# Altium footprint library 6-Connectors-5.PcbLib: 46 footprints (part 5 of 5)
Each footprint in its own frame and in the unit in brackets; x right, y up, seen from the top. Pads: shape width x height; smd on the part's side, far side on the other; paste and mask are expansions set on the pad; w line width, h text height; cw(c..) or ccw(c..) is an arc to the next point about the centre after c.
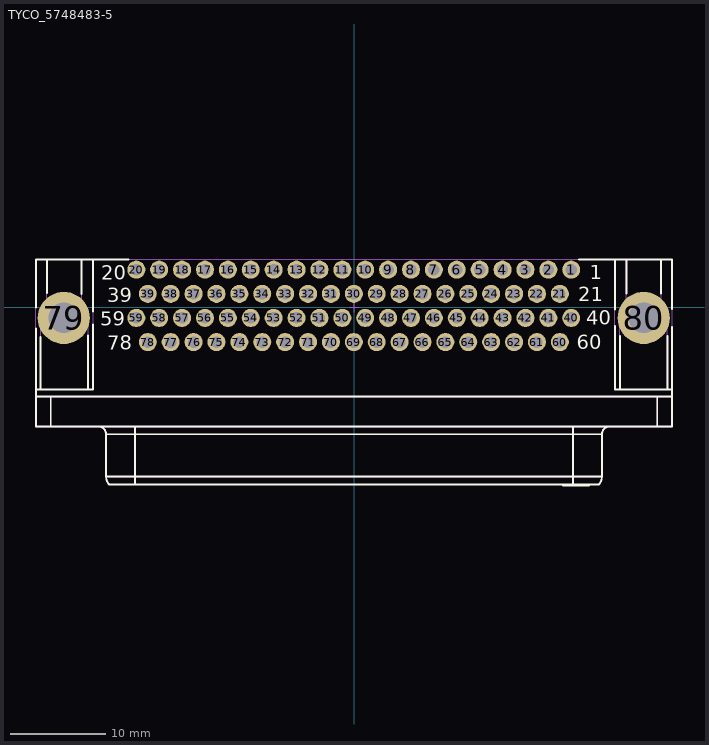
[diagram p4: the footprint, top view; thin cyan lines are the x and y axes]

## TYCO_5748483-5 [mm] "Right Angle D-SUB 78 Female Contacts, Shell Size 5, With Boardlock and Threaded Insert,(4-40 UNC), HD-22 Serie"
height 15.55
pads (80):
  round 1.9 hole 1.2: 1(22.87,3.965) 2(20.46,3.965) 3(18.05,3.965) 4(15.64,3.965) 5(13.23,3.965) 6(10.82,3.965) 7(8.41,3.965) 8(6,3.965) 9(3.59,3.965) 10(1.18,3.965) 11(-1.23,3.965) 12(-3.64,3.965) 13(-6.05,3.965) 14(-8.46,3.965) 15(-10.87,3.965) 16(-13.28,3.965) 17(-15.69,3.965) 18(-18.1,3.965) 19(-20.51,3.965) 20(-22.92,3.965) 21(21.67,1.425) 22(19.26,1.425) 23(16.85,1.425) 24(14.44,1.425) 25(12.03,1.425) 26(9.62,1.425) 27(7.21,1.425) 28(4.8,1.425) 29(2.39,1.425) 30(-0.02,1.425) 31(-2.43,1.425) 32(-4.84,1.425) 33(-7.25,1.425) 34(-9.66,1.425) 35(-12.07,1.425) 36(-14.48,1.425) 37(-16.89,1.425) 38(-19.3,1.425) 39(-21.71,1.425) 40(22.87,-1.115) 41(20.46,-1.115) 42(18.05,-1.115) 43(15.64,-1.115) 44(13.23,-1.115) 45(10.82,-1.115) 46(8.41,-1.115) 47(6,-1.115) 48(3.59,-1.115) 49(1.18,-1.115) 50(-1.23,-1.115) 51(-3.64,-1.115) 52(-6.05,-1.115) 53(-8.46,-1.115) 54(-10.87,-1.115) 55(-13.28,-1.115) 56(-15.69,-1.115) 57(-18.1,-1.115) 58(-20.51,-1.115) 59(-22.92,-1.115) 60(21.67,-3.655) 61(19.26,-3.655) 62(16.85,-3.655) 63(14.44,-3.655) 64(12.03,-3.655) 65(9.62,-3.655) 66(7.21,-3.655) 67(4.8,-3.655) 68(2.39,-3.655) 69(-0.02,-3.655) 70(-2.43,-3.655) 71(-4.84,-3.655) 72(-7.25,-3.655) 73(-9.66,-3.655) 74(-12.07,-3.655) 75(-14.48,-3.655) 76(-16.89,-3.655) 77(-19.3,-3.655) 78(-21.71,-3.655)
  round 5.5 hole 3.2: 79(-30.55,-1.115) 80(30.5,-1.115)
Top Overlay:
  lines w0.2: -33.5,-9.405 33.5,-9.405 ; -33.5,-8.645 -27.47,-8.645 -27.47,-1.775 ; -33.5,-2.22 -33.5,-12.545 33.5,-12.545 33.5,-2.075 ; -33.5,-0.01 -33.5,5.055 -23.717,5.055 ; -33,-8.645 -33,-3.095 ; -32.325,1.487 -32.325,5.055 ; -31.925,-12.545 -31.925,-9.405 ; -28.675,1.416 -28.675,5.055 ; -28,-8.645 -28,-2.964 ; -27.47,-0.455 -27.47,5.055 ; -26.913,-12.545 cw(c-26.913,-13.358) -26.1,-13.358 ; -23.052,-18.645 -23.052,-12.545 ; 22,-18.645 22,-18.745 22.75,-18.745 22.75,-18.645 ; 22.021,-18.745 22.021,-18.645 ; 22.063,-18.745 22.063,-18.645 ; 22.125,-18.745 22.125,-18.645 ; 22.229,-18.745 22.229,-18.645 ; 22.333,-18.745 22.333,-18.645 ; 22.417,-18.745 22.417,-18.645 ; 22.521,-18.745 22.521,-18.645 ; 22.625,-18.745 22.625,-18.645 ; 22.688,-18.745 22.688,-18.645 ; 22.708,-18.745 22.708,-18.645 ; 22.8,-18.645 22.8,-18.745 23.967,-18.745 23.967,-18.645 ; 22.821,-18.745 22.821,-18.645 ; 22.842,-18.745 22.842,-18.645 ; 22.925,-18.745 22.925,-18.645 ; 23.008,-18.745 23.008,-18.645 ; 23.052,-18.645 23.052,-12.545 ; 23.154,-18.745 23.154,-18.645 ; 23.238,-18.745 23.238,-18.645 ; 23.363,-18.745 23.363,-18.645 ; 23.446,-18.745 23.446,-18.645 ; 23.529,-18.745 23.529,-18.645 ; 23.55,-18.745 23.55,-18.645 ; 23.625,-18.745 23.625,-18.645 ; 23.667,5.055 33.5,5.055 33.5,-0.155 ; 23.717,-18.745 23.717,-18.645 ; 23.842,-18.745 23.842,-18.645 ; 24,-18.645 24,-18.745 24.75,-18.745 24.75,-18.645 ; 24.021,-18.745 24.021,-18.645 ; 24.042,-18.745 24.042,-18.645 ; 24.083,-18.745 24.083,-18.645 ; 24.1,-18.745 24.1,-18.645 ; 24.225,-18.745 24.225,-18.645 ; 24.35,-18.745 24.35,-18.645 ; 24.375,-18.745 24.375,-18.645 ; 24.5,-18.745 24.5,-18.645 ; 24.604,-18.745 24.604,-18.645 ; 24.667,-18.745 24.667,-18.645 ; 24.708,-18.745 24.708,-18.645 ; 24.729,-18.745 24.729,-18.645 ; 26.913,-12.545 ccw(c26.913,-13.358) 26.1,-13.358 ; 27.47,-1.976 27.47,-8.645 33.5,-8.645 ; 27.47,-0.254 27.47,5.055 ; 28,-8.645 28,-3.031 ; 28.675,1.452 28.675,5.055 ; 31.925,-12.545 31.925,-9.405 ; 32.325,1.452 32.325,5.055 ; 33,-8.645 33,-3.031 ; -26.1,-17.82 ccw(c-24.83,-17.82) -25.795,-18.645 25.795,-18.645 ccw(c24.83,-17.82) 26.1,-17.82 ; -26.1,-17.82 -26.1,-13.358 ; -26.1,-17.82 26.1,-17.82 ; -26.1,-13.358 26.1,-13.358 ; 26.1,-17.82 26.1,-13.358
  text "20" at -26.629,2.923 h1.5
  text "78" at -25.954,-4.44 h1.5
  text "1" at 24.846,2.963 h1.5
  text "39" at -25.979,0.56 h1.5
  text "59" at -26.733,-1.94 h1.5
  text "21" at 23.596,0.623 h1.5
  text "40" at 24.471,-1.827 h1.5
  text "60" at 23.446,-4.402 h1.5
Mechanical 8:
  drawing of 168 lines, arcs and shapes, not listed
Mechanical 14:
  lines w0.1: -33.5,-9.405 33.5,-9.405 ; -33.5,-8.645 -27.47,-8.645 -27.47,5.055 ; -33,-8.645 -33,-1.115 -31.5,-1.115 -31.5,-0.815 ; -32.325,-1.115 -32.325,5.055 ; -32.325,-0.39 cw(c-30.5,-0.39) -28.675,-0.39 ; -32.155,-1.115 -32.155,-0.815 -30.775,-0.815 -30.775,-1.115 -30.225,-1.115 -30.225,-0.815 -28.845,-0.815 -28.845,-1.115 ; -31.925,-12.545 -31.925,-9.405 ; -31.764,-1.115 -31.764,-0.815 ; -31.68,-1.115 -31.68,-0.815 ; -29.5,-0.815 -29.5,-1.115 -28,-1.115 -28,-8.645 ; -29.32,-1.115 -29.32,-0.815 ; -29.236,-1.115 -29.236,-0.815 ; -28.675,-1.115 -28.675,5.055 ; -26.913,-12.545 cw(c-26.913,-13.358) -26.1,-13.358 ; -23.052,-18.645 -23.052,-12.545 ; 22,-18.645 22,-18.745 22.75,-18.745 22.75,-18.645 ; 22.021,-18.745 22.021,-18.645 ; 22.063,-18.745 22.063,-18.645 ; 22.125,-18.745 22.125,-18.645 ; 22.229,-18.745 22.229,-18.645 ; 22.333,-18.745 22.333,-18.645 ; 22.417,-18.745 22.417,-18.645 ; 22.521,-18.745 22.521,-18.645 ; 22.625,-18.745 22.625,-18.645 ; 22.688,-18.745 22.688,-18.645 ; 22.708,-18.745 22.708,-18.645 ; 22.8,-18.645 22.8,-18.745 23.967,-18.745 23.967,-18.645 ; 22.821,-18.745 22.821,-18.645 ; 22.842,-18.745 22.842,-18.645 ; 22.925,-18.745 22.925,-18.645 ; 23.008,-18.745 23.008,-18.645 ; 23.052,-18.645 23.052,-12.545 ; 23.154,-18.745 23.154,-18.645 ; 23.238,-18.745 23.238,-18.645 ; 23.363,-18.745 23.363,-18.645 ; 23.446,-18.745 23.446,-18.645 ; 23.529,-18.745 23.529,-18.645 ; 23.55,-18.745 23.55,-18.645 ; 23.625,-18.745 23.625,-18.645 ; 23.717,-18.745 23.717,-18.645 ; 23.842,-18.745 23.842,-18.645 ; 24,-18.645 24,-18.745 24.75,-18.745 24.75,-18.645 ; 24.021,-18.745 24.021,-18.645 ; 24.042,-18.745 24.042,-18.645 ; 24.083,-18.745 24.083,-18.645 ; 24.1,-18.745 24.1,-18.645 ; 24.225,-18.745 24.225,-18.645 ; 24.35,-18.745 24.35,-18.645 ; 24.375,-18.745 24.375,-18.645 ; 24.5,-18.745 24.5,-18.645 ; 24.604,-18.745 24.604,-18.645 ; 24.667,-18.745 24.667,-18.645 ; 24.708,-18.745 24.708,-18.645 ; 24.729,-18.745 24.729,-18.645 ; 26.913,-12.545 ccw(c26.913,-13.358) 26.1,-13.358 ; 27.47,5.055 27.47,-8.645 33.5,-8.645 ; 28,-8.645 28,-1.115 29.5,-1.115 29.5,-0.815 ; 28.675,-1.115 28.675,5.055 ; 28.675,-0.39 cw(c30.5,-0.39) 32.325,-0.39 ; 28.845,-1.115 28.845,-0.815 30.225,-0.815 30.225,-1.115 30.775,-1.115 30.775,-0.815 32.155,-0.815 32.155,-1.115 ; 29.236,-1.115 29.236,-0.815 ; 29.32,-1.115 29.32,-0.815 ; 31.5,-0.815 31.5,-1.115 33,-1.115 33,-8.645 ; 31.68,-1.115 31.68,-0.815 ; 31.764,-1.115 31.764,-0.815 ; 31.925,-12.545 31.925,-9.405 ; 32.325,-1.115 32.325,5.055 ; -26.1,-17.82 ccw(c-24.83,-17.82) -25.795,-18.645 25.795,-18.645 ccw(c24.83,-17.82) 26.1,-17.82 ; -26.1,-17.82 -26.1,-13.358 ; -26.1,-17.82 26.1,-17.82 ; -26.1,-13.358 26.1,-13.358 ; 26.1,-17.82 26.1,-13.358 ; -33.5,-12.545 -33.5,5.055 33.5,5.055 33.5,-12.545 -33.5,-12.545
  text "20" at -26.629,2.923 h1.5
  text "78" at -25.954,-4.44 h1.5
  text "1" at 24.846,2.963 h1.5
  text "39" at -25.979,0.56 h1.5
  text "59" at -26.733,-1.94 h1.5
  text "21" at 23.596,0.623 h1.5
  text "40" at 24.471,-1.827 h1.5
  text "60" at 23.446,-4.402 h1.5
3D body "TYCO_5748483-5.stp": height 15.3, standoff -3.5, extent -33.5,-18.745 33.5,5.055